# Altium footprint library XU-GENARAL PCB .PcbLib: 1176 footprints (part 4 of 75)
Each footprint in its own frame and in the unit in brackets; x right, y up, seen from the top. Pads: shape width x height; smd on the part's side, far side on the other; paste and mask are expansions set on the pad; w line width, h text height; cw(c..) or ccw(c..) is an arc to the next point about the centre after c.
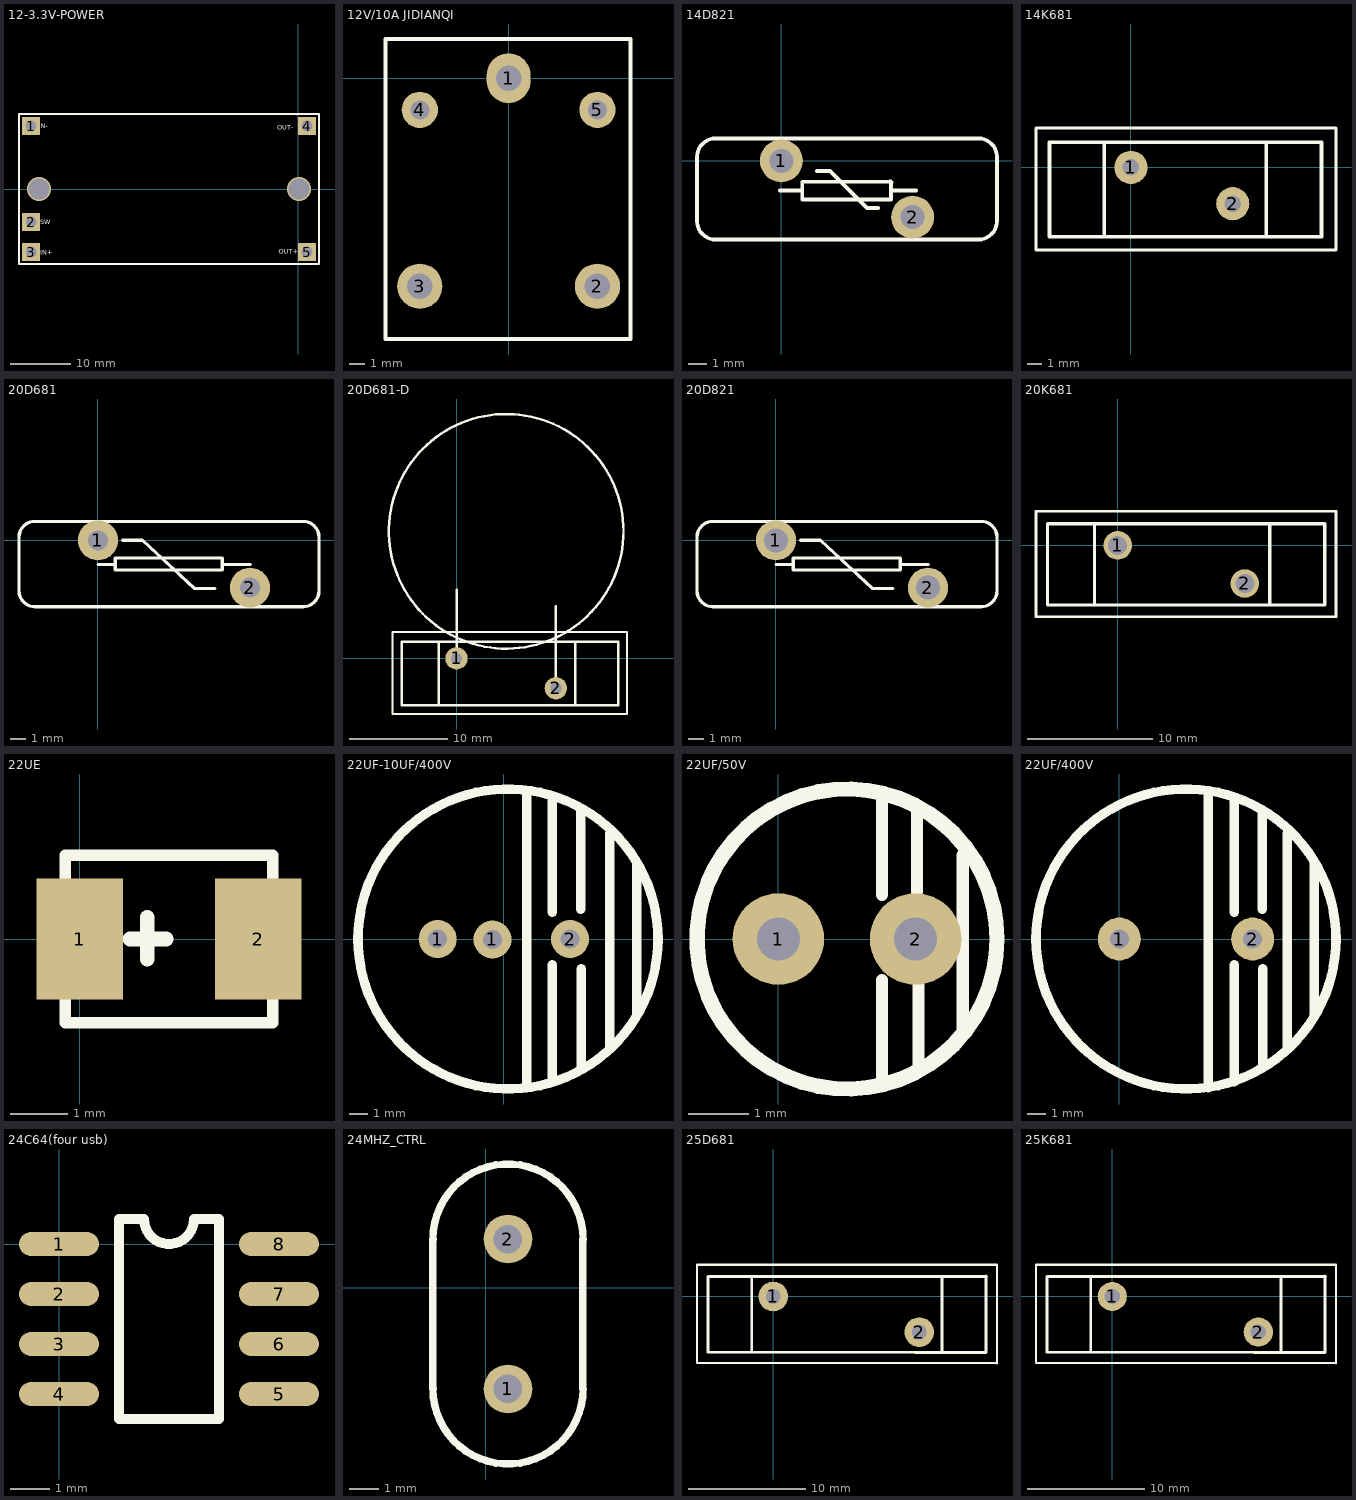
[diagram p3: the footprints below, top view; thin cyan lines are the x and y axes]

## 12-3.3V-POWER [mm]
pads (5):
  rect 3x3 hole 1.8: 1(-44.527,10.5) 2(-44.501,-5.5) 3(-44.501,-10.5) 4(1.473,10.5) 5(1.473,-10.5)
via 0.127,0 diameter 4 hole 3.5
via -43.231,0 diameter 4 hole 3.5
Top Overlay:
  lines w0.254: -46.527,-12.5 3.473,-12.5 3.473,12.5 -46.527,12.5 -46.527,-12.5
  text "OUT+" at -3.226,-10.795 h0.81
  text "OUT-" at -3.48,9.906 h0.81
  text "SW" at -42.977,-5.842 h0.81
  text "IN+" at -42.977,-10.922 h0.81
  text "IN-" at -43.231,10.16 h0.81

## 12V/10A JIDIANQI [mm]
pads (5):
  oval 2.921x3.302 hole 1.7: 1(0,0)
  round 3 hole 1.7: 2(5.89,-13.8) 3(-5.89,-13.8)
  round 2.4 hole 1.26: 4(-5.89,-2.1) 5(5.89,-2.1)
Top Overlay:
  lines w0.254: 8.074,2.541 8.074,-17.3 -8.156,-17.3 -8.156,2.6 8.074,2.6

## 14D821 [mil]
pads (2):
  round 90 hole 50: 1(0,0) 2(275.59,-118.11)
Top Overlay:
  lines w8: -3,-62 42,-62 ; 75,-21 102,-21 180,-99 203,-99 ; 227.59,-44 44,-44 44,-81 230,-81 230,-45 ; 234,-62 283,-62 ; -177.17,-125.98 ccw(c-137.8,-125.98) -137.8,-165.35 413.39,-165.35 ccw(c413.39,-125.98) 452.76,-125.98 452.76,7.87 ccw(c413.39,7.87) 413.39,47.24 -137.8,47.24 ccw(c-137.8,7.87) -177.17,7.87 -177.17,-125.98
  lines w10: 227.59,-44 cw(c227.59,-47.41) 230,-45

## 14K681 [mil]
pads (2):
  round 90 hole 45: 1(0,0) 2(275.59,-98.42)
Top Overlay:
  lines w8: -257,-224 555.12,-224 555.12,106.71 -257,106.71 -257,-224
  lines w10: 366.14,-187.95 366.14,67.95 ; -72.44,-187.95 478.74,-187.95 515.75,-187.95 515.75,67.95 478.74,67.95 -72.44,67.95 ; -72.44,-187.95 -72.44,67.95 ; -72.44,-187.95 -220.5,-187.95 -220.5,67.95 -72.44,67.95

## 20D681 [mil]
pads (2):
  round 100 hole 50: 1(0,0) 2(379,-118)
Top Overlay:
  lines w8: 0,-60 43,-60 ; 61,0 111,0 240,-120 291,-120 ; 310,-60 380,-60 ; -196.85,-125.98 ccw(c-157.48,-125.98) -157.48,-165.35 511.81,-165.35 ccw(c511.81,-125.98) 551.18,-125.98 551.18,7.87 ccw(c511.81,7.87) 511.81,47.24 -157.48,47.24 ccw(c-157.48,7.87) -196.85,7.87 -196.85,-125.98 ; 43,-74 43,-44 310,-44 310,-74 43,-74

## 20D681-D [mil]
pads (2):
  round 90 hole 45: 1(0,0) 2(400,-120)
Top Overlay:
  circle w10: c200,511.81 r472.44
  lines w8: -257,-224 687,-224 687,106.71 -257,106.71 -257,-224
  lines w10: 0,0 0,277 ; 400,-120 400,209 ; -72.44,-187.95 478.74,-187.95 ; -72.44,-187.95 -72.44,67.95 ; -72.44,-187.95 -220.5,-187.95 -220.5,67.95 -72.44,67.95 ; -72.44,67.95 478.74,67.95 ; 478.74,-187.95 478.74,67.95 ; 478.74,-187.95 651.55,-187.95 651.55,67.95 478.74,67.95

## 20D821 [mil]
pads (2):
  round 100 hole 60: 1(0,0) 2(379,-118)
Top Overlay:
  lines w8: 0,-60 43,-60 ; 61,0 111,0 240,-120 291,-120 ; 310,-60 380,-60 ; -196.85,-125.98 ccw(c-157.48,-125.98) -157.48,-165.35 511.81,-165.35 ccw(c511.81,-125.98) 551.18,-125.98 551.18,7.87 ccw(c511.81,7.87) 511.81,47.24 -157.48,47.24 ccw(c-157.48,7.87) -196.85,7.87 -196.85,-125.98 ; 43,-74 43,-44 310,-44 310,-74 43,-74

## 20K681 [mil]
pads (2):
  round 90 hole 60: 1(0,0) 2(400,-120)
Top Overlay:
  lines w8: -257,-224 687,-224 687,106.71 -257,106.71 -257,-224
  lines w10: -72.44,-187.95 478.74,-187.95 ; -72.44,-187.95 -72.44,67.95 ; -72.44,-187.95 -220.5,-187.95 -220.5,67.95 -72.44,67.95 ; -72.44,67.95 478.74,67.95 ; 478.74,-187.95 478.74,67.95 ; 478.74,-187.95 651.55,-187.95 651.55,67.95 478.74,67.95

## 22UE [mm]
pads (2):
  rect 1.5x2.1 smd: 1(0,0) 2(3.099,0)
Top Overlay:
  lines w0.2: -0.25,-1.45 3.35,-1.45 3.35,1.45 -0.25,1.45 -0.25,-1.45
  lines w0.254: 0.875,0 1.499,0 ; 1.175,-0.35 1.175,0.375

## 22UF-10UF/400V [mil]
pads (3):
  round 80 hole 40: 1(-139,0) 1(-24,-1) 2(139,0)
Top Overlay:
  circle w20: c8.64,0 r314.96
  lines w20: 48,-312 48,310 ; 102,-300 102,-54 ; 102,56 102,298 ; 161,62 161,267 ; 162,-266 162,-62 ; 222,-227 222,222 ; 279,-161 279,161

## 22UF/50V [mil]
pads (2):
  round 60 hole 28: 1(0,0) 2(90,0)
Top Overlay:
  circle w10: c45,0 r98.42
  lines w8: 68,-95 68,-27 ; 68,29 68,95 ; 91,31 91,87 ; 92,-85 92,-26 ; 121,-59 121,55

## 22UF/400V [mil]
pads (2):
  round 90 hole 40: 1(0,0) 2(280,0)
Top Overlay:
  circle w20: c140,0 r314.96
  lines w20: 187,-312 187,310 ; 241,-300 241,-54 ; 241,56 241,298 ; 300,62 300,267 ; 301,-266 301,-62 ; 353,-227 353,222 ; 409,-162 409,160

## 24C64(four usb) [mil]
height 68.9
pads (8):
  oval 80x24 smd: 1(0,0) 2(0,-50) 3(0,-100) 4(0,-150) 5(220,-150) 6(220,-100) 7(220,-50) 8(220,0)
Top Overlay:
  lines w10: 60,-175 60,25 85,25 ccw(c110,25) 135,25 160,25 160,-175 60,-175

## 24MHZ_CTRL [mil]
height 68.9
pads (2):
  round 65 hole 38: 1(30,-135) 2(30,65)
Top Overlay:
  lines w10: -70,-135 ccw(c30,-135) 130,-135 130,65 ccw(c30,65) -70,65 -70,-135

## 25D681 [mil]
pads (2):
  round 100 hole 50: 1(0,0) 2(492.13,-120)
Top Overlay:
  lines w8: 753,107 -257,106.71 -257,-224 754,-225 754,105.71
  lines w10: 478,-188 717,-188 ; 478.74,-187.95 -72.44,-187.95 ; 569,-189 569,66.91 ; 717,-186 717.5,68.95 ; 718,68 478.74,67.95 -72.44,67.95 ; -72.44,-187.95 -220.5,-187.95 -220.5,67.95 -72.44,67.95 ; -72.44,-187.95 -72.44,67.95

## 25K681 [mm]
pads (2):
  round 2.5 hole 1.3: 1(0,0) 2(12.5,-3.048)
Top Overlay:
  lines w0.203: 19.126,2.718 -6.528,2.71 -6.528,-5.69 19.152,-5.715 19.152,2.685
  lines w0.254: 12.141,-4.775 18.212,-4.775 ; 12.16,-4.774 -1.84,-4.774 ; 14.453,-4.801 14.453,1.699 ; 18.212,-4.724 18.224,1.751 ; 18.237,1.727 12.16,1.726 -1.84,1.726 ; -1.84,-4.774 -1.84,1.726 ; -1.84,-4.774 -5.601,-4.774 -5.601,1.726 -1.84,1.726